# Altium footprint library UWB_CAN_R2.PcbLib: 83 footprints (part 4 of 6)
Each footprint in its own frame and in the unit in brackets; x right, y up, seen from the top. Pads: shape width x height; smd on the part's side, far side on the other; paste and mask are expansions set on the pad; w line width, h text height; cw(c..) or ccw(c..) is an arc to the next point about the centre after c.
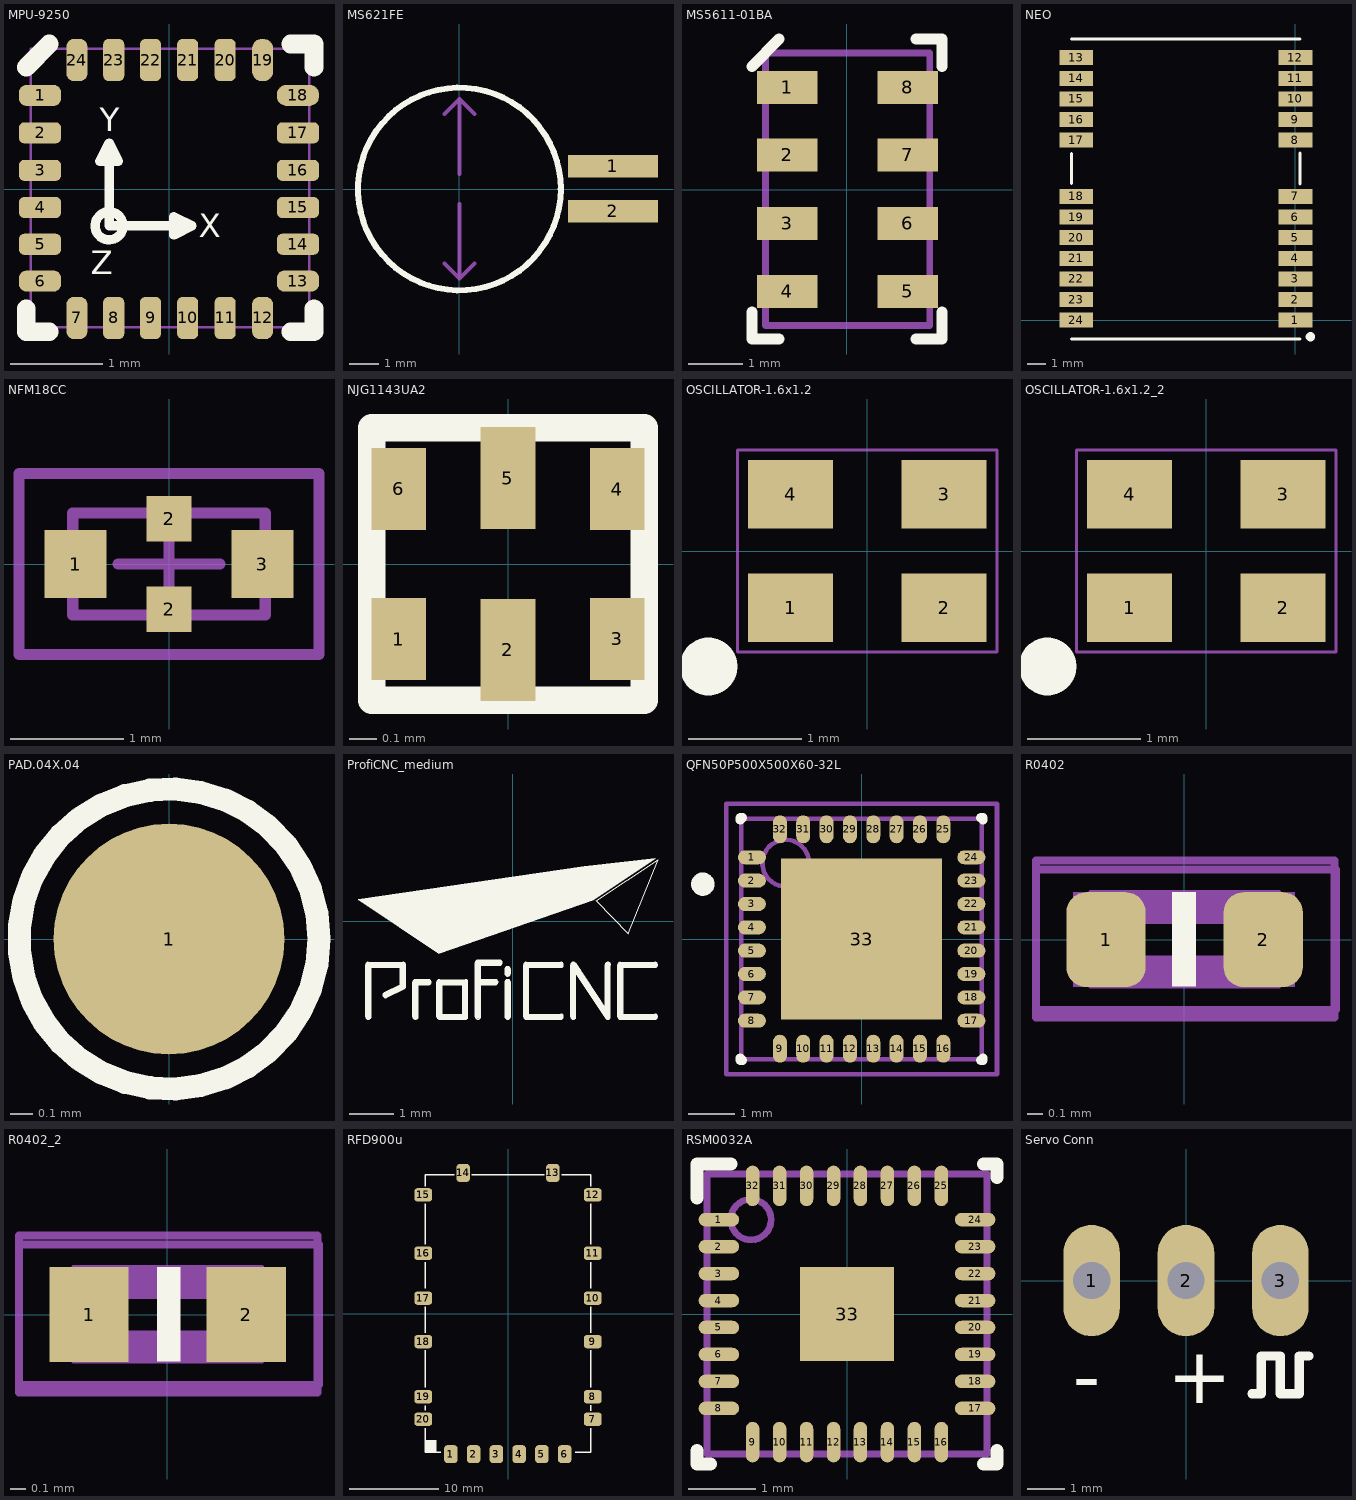
[diagram p3: the footprints below, top view; thin cyan lines are the x and y axes]

## MPU-9250 [mm] "MPU-9250"
height 1.1
pads (24):
  rrect70% 0.457x0.229 smd mask+0.05: 1(-1.4,1.016) 6(-1.4,-1) 13(1.4,-1)
  rrect50% 0.457x0.229 smd mask+0.05: 2(-1.4,0.61) 3(-1.4,0.203) 4(-1.4,-0.2) 5(-1.4,-0.6) 14(1.4,-0.6) 15(1.4,-0.2) 16(1.4,0.203) 17(1.4,0.61)
  rrect70% 0.229x0.457 smd mask+0.05: 7(-1,-1.4) 12(1.016,-1.4) 24(-1,1.4)
  rrect50% 0.229x0.457 smd mask+0.05: 8(-0.6,-1.4) 9(-0.2,-1.4) 10(0.203,-1.4) 11(0.61,-1.4) 20(0.61,1.4) 21(0.203,1.4) 22(-0.2,1.4) 23(-0.6,1.4)
  rrect90% 0.457x0.229 smd mask+0.05: 18(1.4,1.016)
  rrect90% 0.229x0.457 smd mask+0.05: 19(1.016,1.4)
Top Overlay:
  circle w0.102: c-0.65,-0.4 r0.152
  lines w0.102: -0.65,0.5 -0.55,0.3 -0.75,0.3 -0.65,0.5 ; -0.65,0.5 -0.65,-0.4 0.25,-0.4 ; 0.25,-0.4 0.05,-0.3 0.05,-0.5 0.25,-0.4
  lines w0.203: -1.55,-1.3 -1.55,-1.55 -1.3,-1.55 ; -1.55,1.321 -1.3,1.575 ; 1.321,-1.55 1.575,-1.55 1.575,-1.3 ; 1.321,1.575 1.575,1.575 1.575,1.321
  text "X" at 0.325,-0.525 h0.26
  text "Z" at -0.85,-0.925 h0.26
  text "Y" at -0.75,0.625 h0.26
Mechanical 16:
  lines w0.025: -1.5,-1.5 1.524,-1.5 1.524,1.524 -1.5,1.524 -1.5,-1.5

## MS621FE [mil] "MS621FE"
height 43.31
pads (2):
  rect 119x30 smd: 1(203,30) 2(203,-29.53)
Top Overlay:
  circle w8: c0,0 r134
Mechanical 16:
  region: 256,-19.69 170,-19.69 170,-39.37 256,-39.37
  region: 256,20 256,40 170,40 170,20
  lines w5: -19.69,-98.43 0,-118.11 ; -19.69,99 0,119 ; 0,-19.69 0,-118.11 ; 0,20 0,119 ; 20,-98.43 0,-118.11 ; 20,99 0,119
  text "6.8MM" at -47.24,-11.81 h37.2

## MS5611-01BA [mil] "MS5611-01BA"
height 43.31
pads (8):
  rect 44x24 smd: 1(-43.31,74) 2(-43.31,25) 3(-43.31,-24.61) 4(-43.31,-73.82) 5(44,-73.82) 6(44,-24.61) 7(44,25) 8(44,74)
Top Overlay:
  lines w8: -68.9,-88.58 -68.9,-108.27 -49.21,-108.27 ; -68.9,89 -49.21,109 ; 50,-108.27 69,-108.27 69,-88.58 ; 50,109 69,109 69,89
Mechanical 16:
  lines w1: -59.06,-98.43 -59.06,99 60,99 60,-98.43 -59.06,-98.43
  lines w5: -59.06,-98.43 -59.06,99 60,99 60,-98.43 -59.06,-98.43
3D body "MS5611-01BA03.STEP": height 39.37, standoff -1.97, extent -59.32,-97.97 58.79,98.88

## NEO [mm] "u-blox NEO GNSS module"
height 1.1
pads (24):
  rect 1.8x0.8 smd paste-0.1: 1(0,0) 2(0,1.1) 3(0,2.2) 4(0,3.3) 5(0,4.4) 6(0,5.5) 7(0,6.6) 8(0,9.6) 9(0,10.7) 10(0,11.8) 11(0,12.9) 12(0,14) 13(-11.684,14) 14(-11.684,12.9) 15(-11.684,11.8) 16(-11.684,10.7) 17(-11.684,9.6) 18(-11.684,6.6) 19(-11.684,5.5) 20(-11.684,4.4) 21(-11.684,3.3) 22(-11.684,2.2) 23(-11.684,1.1) 24(-11.684,0)
Top Overlay:
  circle w0.38: c0.794,-0.879 r0.058
  lines w0.16: -11.951,-1 0.254,-1 ; -11.951,14.996 0.248,14.996 ; -11.944,7.299 -11.944,8.893 ; 0.254,7.255 0.254,8.919
Top Paste:
  rectangle: -12.675,2.9 -11.475,3.7
  rectangle: -12.675,-0.4 -11.475,0.4
  rectangle: -12.675,0.7 -11.475,1.5
  rectangle: -12.675,1.8 -11.475,2.6
  rectangle: -12.675,4 -11.475,4.8
  rectangle: -12.675,5.1 -11.475,5.9
  rectangle: -12.675,6.2 -11.475,7
  rectangle: -12.675,9.2 -11.475,10
  rectangle: -12.675,10.3 -11.475,11.1
  rectangle: -12.675,11.4 -11.475,12.2
  rectangle: -12.675,12.5 -11.475,13.3
  rectangle: -12.675,13.6 -11.475,14.4
  rectangle: -0.2,13.6 1,14.4
  rectangle: -0.2,12.5 1,13.3
  rectangle: -0.2,11.4 1,12.2
  rectangle: -0.2,10.3 1,11.1
  rectangle: -0.2,9.2 1,10
  rectangle: -0.2,6.2 1,7
  rectangle: -0.2,5.1 1,5.9
  rectangle: -0.2,4 1,4.8
  rectangle: -0.2,2.9 1,3.7
  rectangle: -0.2,1.8 1,2.6
  rectangle: -0.2,0.7 1,1.5
  rectangle: -0.2,-0.4 1,0.4
3D body "NEO (STEP-AP214)_B.STEP": height 2.28, standoff -0.05, extent -11.946,-1 0.254,15

## NFM18CC [mm] "Chip Capacitor, 3-Leads, Body 1.6x0.8mm"
height 0.7
pads (4):
  rect 0.55x0.6 smd: 1(-0.825,0) 3(0.825,0)
  rect 0.4x0.4 smd: 2(0,-0.4) 2(0,0.4)
Mechanical 13:
  lines w0.1: -0.85,-0.45 0.85,-0.45 0.85,0.45 -0.85,0.45 -0.85,-0.45
Mechanical 15:
  lines w0.1: -0.45,0 0.45,0 ; 0,-0.45 0,0.45 ; -1.325,-0.8 -1.325,0.8 1.325,0.8 1.325,-0.8 -1.325,-0.8
3D body: height 0.7, standoff 0, extent -0.85,-0.45 0.85,0.45

## NJG1143UA2 [mm] "LNA Filter uBloxM8P"
height 0.5
pads (6):
  rect 0.2x0.3 smd: 1(-0.4,-0.275) 3(0.4,-0.275) 4(0.4,0.275) 6(-0.4,0.275)
  rect 0.2x0.375 smd: 2(0,-0.315) 5(0,0.315)
Top Overlay:
  lines w0.1: -0.5,-0.5 0.5,-0.5 0.5,0.5 -0.5,0.5 -0.5,-0.5

## OSCILLATOR-1.6x1.2 [mm] "OSCILLATOR-1.6x1.2"
height 1.1
pads (4):
  rect 0.75x0.6 smd: 1(-0.675,-0.5) 2(0.675,-0.5) 3(0.675,0.5) 4(-0.675,0.5)
Top Overlay:
  circle w0.305: c-1.397,-1.016 r0.102
Mechanical 16:
  lines w0.025: -1.143,-0.889 1.141,-0.889 1.141,0.889 -1.143,0.889 -1.143,-0.889

## OSCILLATOR-1.6x1.2_2 [mm]
pads (4):
  rect 0.75x0.6 smd: 1(-0.675,-0.5) 2(0.675,-0.5) 3(0.675,0.5) 4(-0.675,0.5)
Top Overlay:
  circle w0.305: c-1.397,-1.016 r0.102
Mechanical 16:
  lines w0.025: -1.143,-0.889 1.141,-0.889 1.141,0.889 -1.143,0.889 -1.143,-0.889

## PAD.04X.04 [mil]
height 66.93
pads (1):
  rrect100% 40x40 smd paste-78.74: 1(0,0)
Top Overlay:
  circle w4: c0,0 r26

## ProfiCNC_medium [mm] "ProfiCNC_medium"
Top Overlay:
  drawing of 1227 lines, arcs and shapes, not listed
Top Solder:
  region: 1.894,0.462 3.265,1.366 2.603,-0.27

## QFN50P500X500X60-32L [mm] "QFN, 32-Leads, Body 5.2x5.2mm (max), Pitch 0.50mm, IPC High Density"
height 0.6
pads (33):
  oval 0.6x0.3 smd: 1(-2.35,1.75) 2(-2.35,1.25) 3(-2.35,0.75) 4(-2.35,0.25) 5(-2.35,-0.25) 6(-2.35,-0.75) 7(-2.35,-1.25) 8(-2.35,-1.75) 17(2.35,-1.75) 18(2.35,-1.25) 19(2.35,-0.75) 20(2.35,-0.25) 21(2.35,0.25) 22(2.35,0.75) 23(2.35,1.25) 24(2.35,1.75)
  oval 0.3x0.6 smd: 9(-1.75,-2.35) 10(-1.25,-2.35) 11(-0.75,-2.35) 12(-0.25,-2.35) 13(0.25,-2.35) 14(0.75,-2.35) 15(1.25,-2.35) 16(1.75,-2.35) 25(1.75,2.35) 26(1.25,2.35) 27(0.75,2.35) 28(0.25,2.35) 29(-0.25,2.35) 30(-0.75,2.35) 31(-1.25,2.35) 32(-1.75,2.35)
  rect 3.45x3.45 smd: 33(0,0)
Top Overlay:
  circle w0.25: c-3.4,1.175 r0.125
  lines w0.2: -2.6,-2.55 -2.6,-2.6 -2.55,-2.6 ; -2.6,2.55 -2.6,2.6 -2.55,2.6 ; 2.55,-2.6 2.6,-2.6 2.6,-2.55 ; 2.55,2.6 2.6,2.6 2.6,2.55
Mechanical 13:
  circle w0.1: c-1.625,1.625 r0.5
  lines w0.1: -2.575,-2.575 -2.575,2.575 2.575,2.575 2.575,-2.575 -2.575,-2.575
Mechanical 15:
  lines w0.1: -0.5,0 0.5,0 ; 0,-0.5 0,0.5 ; -2.9,-2.9 -2.9,2.9 2.9,2.9 2.9,-2.9 -2.9,-2.9
3D body: height 0.6, standoff 0, extent -2.575,-2.575 2.575,2.575

## R0402 [mil]
height 43.31
pads (2):
  rrect50% 20x24 smd: 1(-19.68,0) 2(20,0)
Top Overlay:
  rectangle: -3.04,-11.82 2.96,11.99
Mechanical 2:
  lines w1.97: -37.4,-17.72 38.39,-17.72 38.39,17.72 -37.4,17.72 -37.4,-17.72
Mechanical 16:
  rectangle: -28,-12 -16,12
  rectangle: 16,-12 28,12
  lines w1: -23.62,-11.81 24,-11.81 24,12 -23.62,12 -23.62,-11.81
  lines w2: -37.4,-19.69 38,-19.68 38,20 -37.4,20 -37.4,-19.69
  lines w8: -20,-8 20,-8 ; -20,8 20,8
3D body "RES0402.stp": height 11.81, standoff 0, extent -19.68,-9.84 19.69,9.85

## R0402_2 [mil]
pads (2):
  rect 20x24 smd: 1(-19.69,0) 2(20,0)
Top Overlay:
  rectangle: -2.6,-11.82 3.4,11.99
Mechanical 2:
  lines w1.97: -37.4,-17.72 -37.4,17.72 38.39,17.72 38.39,-17.72 -37.4,-17.72
Mechanical 15:
  rectangle: 16,-12 28,12
  rectangle: -28,-12 -16,12
  lines w1: -23.62,-11.81 -23.62,12 24,12 24,-11.81 -23.62,-11.81
  lines w2: -37.4,-19.69 -37.4,20 38,20 38,-19.69 -37.4,-19.69
  lines w8: -20,-8 20,-8 ; -20,8 20,8
3D body "RES0402.stp": height 11.81, standoff 0, extent -19.68,-9.84 19.69,9.85

## RFD900u [mm] "RFD900u Modem"
height 3
pads (40):
  rrect50% 1.5x2 smd: 1(-6.375,-15.675) 2(-3.835,-15.675) 3(-1.295,-15.675) 4(1.245,-15.675) 5(3.785,-15.675) 6(6.325,-15.675) 13(5,15.675) 14(-5,15.675)
  rrect50% 1.5x2.2 on Mech5: 1(-6.375,-15.675) 2(-3.835,-15.675) 3(-1.295,-15.675) 4(1.245,-15.675) 5(3.785,-15.675) 6(6.325,-15.675)
  rrect50% 2x1.5 smd: 7(9.45,-11.775) 8(9.45,-9.275) 9(9.45,-3.125) 10(9.45,1.725) 11(9.45,6.725) 12(9.45,13.225) 15(-9.45,13.225) 16(-9.45,6.725) 17(-9.45,1.725) 18(-9.45,-3.125) 19(-9.45,-9.275) 20(-9.45,-11.775)
  rrect50% 2x1.5 on Mech5: 7(9.45,-11.775) 8(9.45,-9.275) 9(9.45,-3.125) 10(9.45,1.725) 11(9.45,6.725) 12(9.45,13.225) 15(-9.45,13.225) 16(-9.45,6.725) 17(-9.45,1.725) 18(-9.45,-3.125) 19(-9.45,-9.275) 20(-9.45,-11.775)
  rrect50% 1.5x2 on Mech5: 13(5,15.675) 14(-5,15.675)
Top Overlay:
  rectangle: -9.25,-15.475 -7.95,-14.1
  lines w0.15: -9.25,-12.775 -9.25,-15.475 -7.525,-15.475 ; -9.25,-10.775 -9.25,-10.275 ; -9.25,-8.225 -9.25,-4.1 ; -9.25,-2.15 -9.25,0.75 ; -9.25,2.825 -9.25,5.7 ; -9.25,7.75 -9.25,12.25 ; -9.25,14.2 -9.25,15.45 -5.975,15.45 ; -4.025,15.45 4.05,15.45 ; 5.975,15.45 9.25,15.45 9.25,14.2 ; 7.525,-15.475 9.25,-15.475 9.25,-12.775 ; 9.25,-10.825 9.25,-10.225 ; 9.25,-8.225 9.25,-4.1 ; 9.25,-2.15 9.25,0.75 ; 9.25,2.825 9.25,5.7 ; 9.25,7.75 9.25,12.25

## RSM0032A [mm] "QFN, 32-Leads, Body 4x4mm, Pitch 0.4mm, Thermal Pad 2.7x2.7mm, TI Recommended"
height 1
pads (33):
  oval 0.6x0.2 smd: 1(-1.9,1.4) 2(-1.9,1) 3(-1.9,0.6) 4(-1.9,0.2) 5(-1.9,-0.2) 6(-1.9,-0.6) 7(-1.9,-1) 8(-1.9,-1.4) 17(1.9,-1.4) 18(1.9,-1) 19(1.9,-0.6) 20(1.9,-0.2) 21(1.9,0.2) 22(1.9,0.6) 23(1.9,1) 24(1.9,1.4)
  oval 0.2x0.6 smd: 9(-1.4,-1.9) 10(-1,-1.9) 11(-0.6,-1.9) 12(-0.2,-1.9) 13(0.2,-1.9) 14(0.6,-1.9) 15(1,-1.9) 16(1.4,-1.9) 25(1.4,1.9) 26(1,1.9) 27(0.6,1.9) 28(0.2,1.9) 29(-0.2,1.9) 30(-0.6,1.9) 31(-1,1.9) 32(-1.4,1.9)
  rect 1.4x1.4 smd paste-0.7: 33(0,0)
Top Overlay:
  lines w0.2: -2.225,-2.025 -2.225,-2.225 -2.025,-2.225 ; -2.225,1.725 -2.225,2.225 -1.725,2.225 ; 2.025,-2.225 2.225,-2.225 2.225,-2.025 ; 2.025,2.225 2.225,2.225 2.225,2.025
Top Paste:
  rectangle: -0.649,-0.649 0.649,0.649
Mechanical 5:
  circle w0.1: c-1.425,1.4 r0.3
  lines w0.1: -2.075,-2.075 -2.075,2.075 2.075,2.075 2.075,-2.075 -2.075,-2.075
3D body: height 1, standoff 0, extent -2.075,-2.075 2.075,2.075
3D body: height 1.01, standoff 0.5, extent -1.724,1.101 -1.126,1.7

## Servo Conn [mm]
height 1.1
pads (3):
  oval 1.524x3 hole 1: 1(-2.54,0) 2(0,0) 3(2.54,0)
Top Overlay:
  lines w0.254: 1.778,-3.048 2.032,-3.048 2.032,-2.032 2.54,-2.032 2.54,-3.048 3.048,-3.048 3.048,-2.032 3.302,-2.032
  text "+" at -0.508,-3.302 h1.52
  text "-" at -3.048,-3.302 h1.52